# Altium schematic symbol library MCU_ST_STM32F4.SchLib: 300 symbols (part 8 of 10)
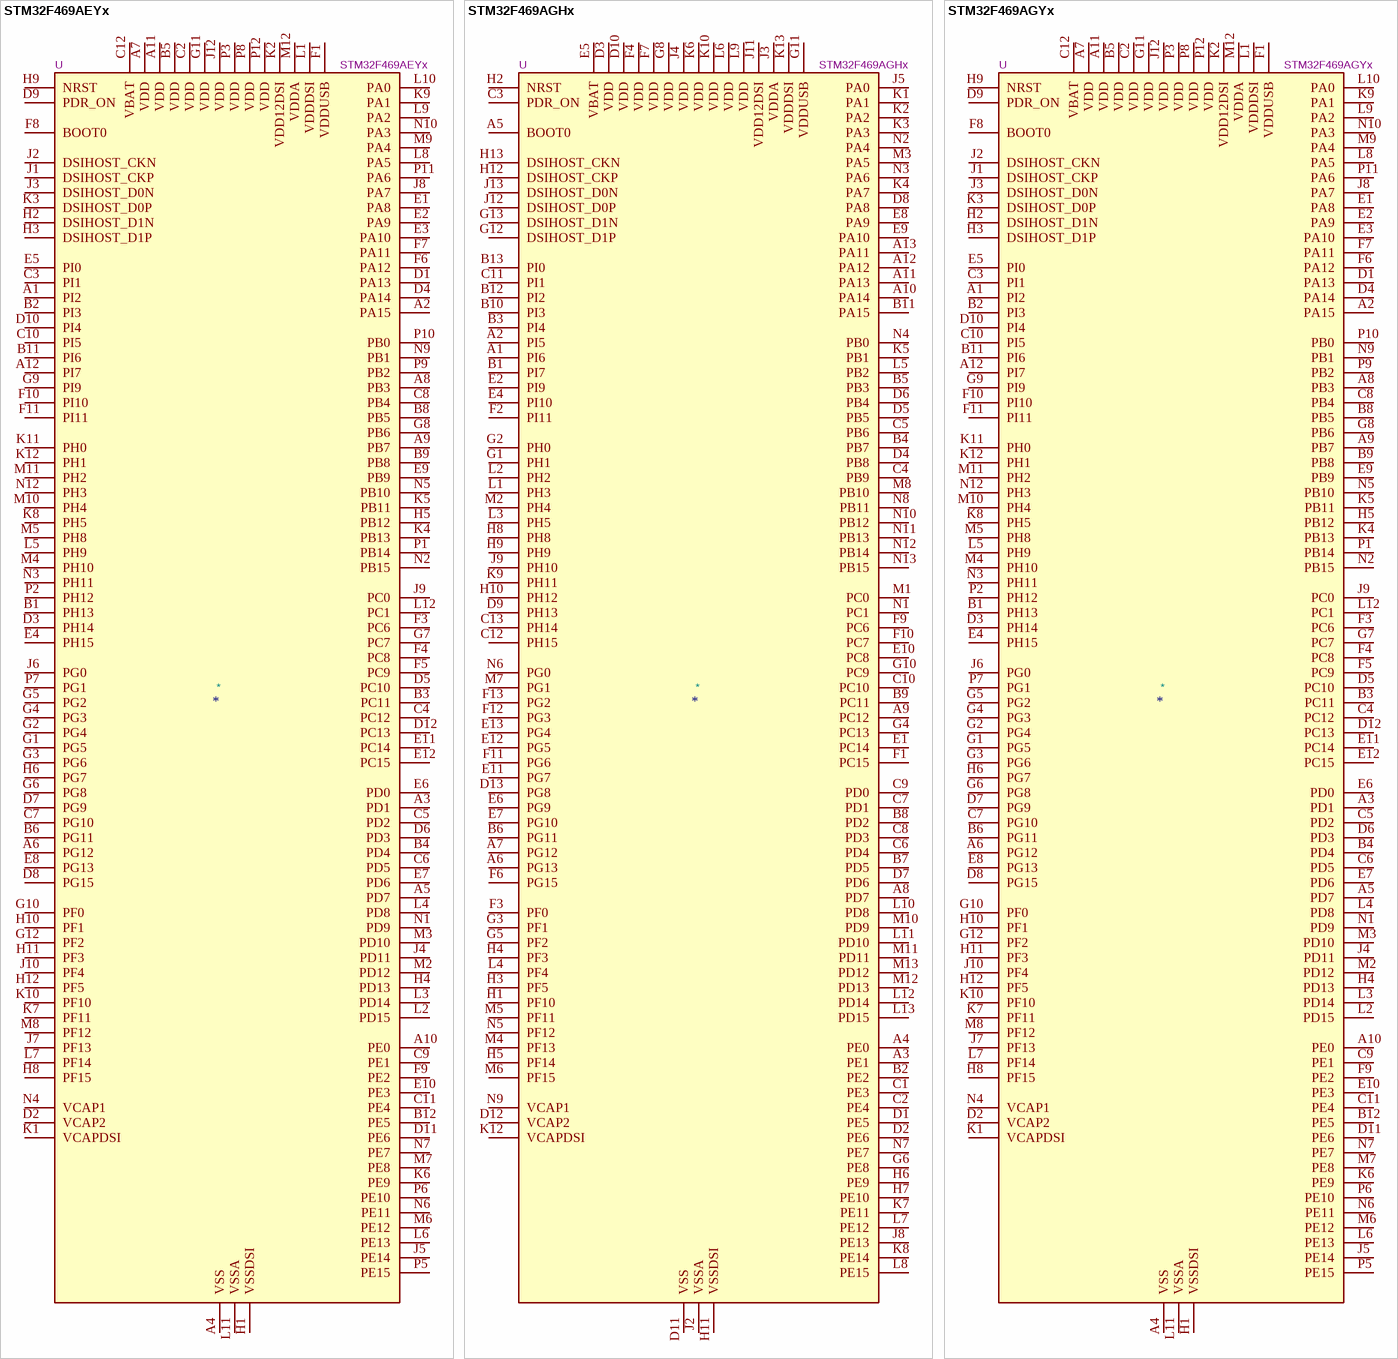
[diagram p83: symbols STM32F469AEYx to STM32F469AGYx]

## STM32F469AGHx
designator *  value STM32F469AGHx  Reference: U
ki_keywords: Arm Cortex-M4 STM32F4 STM32F469/479; ki_description: STMicroelectronics Arm Cortex-M4 MCU, 1024KB flash, 384KB RAM, 180 MHz, 1.7-3.6V, 128 GPIO, UFBGA169; ki_fp_filters: *UFBGA*7x7mm*Layout13x13*P0.5mm*; Footprint: Package_BGA:UFBGA-169_7x7mm_Layout13x13_P0.5mm; Datasheet: https://www.st.com/resource/en/datasheet/stm32f469ag.pdf
pins: A1 PI6, A2 PI5, A3 PE1, A4 PE0, A5 BOOT0, A6 PG13, A7 PG12, A8 PD7, A9 PC12, A10 PA14, A11 PA13, A12 PA12, A13 PA11, B1 PI7, B2 PE2, B3 PI4, B4 PB7, B5 PB3, B6 PG11, B7 PD5, B8 PD2, B9 PC11, B10 PI3, B11 PA15, B12 PI2, B13 PI0, C1 PE3, C2 PE4, C3 PDR_ON, C4 PB9, C5 PB6, C6 PD4, C7 PD1, C8 PD3, C9 PD0, C10 PC10, C11 PI1, C12 PH15, C13 PH14, D1 PE5, D2 PE6, D3 VDD, D4 PB8, D5 PB5, D6 PB4, D7 PD6, D8 PA8, D9 PH13, D10 VDD, D11 VSS, D12 VCAP2, D13 PG8, E1 PC14, E2 PI9, E3 VSS hidden, E4 PI10, E5 VBAT, E6 PG9, E7 PG10, E8 PA9, E9 PA10, E10 PC8, E11 PG7, E12 PG5, E13 PG4, F1 PC15, F2 PI11, F3 PF0, F4 VDD, F5 VSS hidden, F6 PG15, F7 VDD, F8 VSS hidden, F9 PC6, F10 PC7, F11 PG6, F12 PG3, F13 PG2, G1 PH1, G2 PH0, G3 PF1, G4 PC13, G5 PF2, G6 PE8, G7 VSS hidden, G8 VDD, G9 VSS hidden, G10 PC9, G11 VDDUSB, G12 DSIHOST_D1P, G13 DSIHOST_D1N, H1 PF10, H2 NRST, H3 PF5, H4 PF3, H5 PF14, H6 PE9, H7 PE10, H8 PH8, H9 PH9, H10 PH12, H11 VSSDSI, H12 DSIHOST_CKP, H13 DSIHOST_CKN, J1 VSS hidden, J2 VSSA, J3 VDDA, J4 VDD, J5 PA0, J6 VSS hidden, J7 VSS hidden, J8 PE13, J9 PH10, J10 VSS hidden, J11 VDD12DSI, J12 DSIHOST_D0P, J13 DSIHOST_D0N, K1 PA1, K2 PA2, K3 PA3, K4 PA7, K5 PB1, K6 VDD, K7 PE11, K8 PE14, K9 PH11, K10 VDD, K11 VSSDSI hidden, K12 VCAPDSI, K13 VDDDSI, L1 PH3, L2 PH2, L3 PH5, L4 PF4, L5 PB2, L6 VDD, L7 PE12, L8 PE15, L9 VDD, L10 PD8, L11 PD10, L12 PD14, L13 PD15, M1 PC0, M2 PH4, M3 PA5, M4 PF13, M5 PF11, M6 PF15, M7 PG1, M8 PB10, M9 VSS hidden, M10 PD9, M11 PD11, M12 PD13, M13 PD12, N1 PC1, N2 PA4, N3 PA6, N4 PB0, N5 PF12, N6 PG0, N7 PE7, N8 PB11, N9 VCAP1, N10 PB12, N11 PB13, N12 PB14, N13 PB15

## STM32F469AGYx
designator *  value STM32F469AGYx  Reference: U
ki_keywords: Arm Cortex-M4 STM32F4 STM32F469/479; ki_description: STMicroelectronics Arm Cortex-M4 MCU, 1024KB flash, 384KB RAM, 180 MHz, 1.7-3.6V, 128 GPIO, WLCSP168; ki_fp_filters: ST*WLCSP*Die434*; Footprint: Package_CSP:ST_WLCSP-168_Die434; Datasheet: https://www.st.com/resource/en/datasheet/stm32f469ag.pdf
pins: A1 PI2, A2 PA15, A3 PD1, A4 VSS, A5 PD7, A6 PG12, A7 VDD, A8 PB3, A9 PB7, A10 PE0, A11 VDD, A12 PI7, B1 PH13, B2 PI3, B3 PC11, B4 PD4, B5 VDD, B6 PG11, B7 VSS hidden, B8 PB5, B9 PB8, B10 VSS hidden, B11 PI6, B12 PE5, C1 VSS hidden, C2 VDD, C3 PI1, C4 PC12, C5 PD2, C6 PD5, C7 PG10, C8 PB4, C9 PE1, C10 PI5, C11 PE4, C12 VBAT, D1 PA13, D2 VCAP2, D3 PH14, D4 PA14, D5 PC10, D6 PD3, D7 PG9, D8 PG15, D9 PDR_ON, D10 PI4, D11 PE6, D12 PC13, E1 PA8, E2 PA9, E3 PA10, E4 PH15, E5 PI0, E6 PD0, E7 PD6, E8 PG13, E9 PB9, E10 PE3, E11 PC14, E12 PC15, F1 VDDUSB, F2 VSS hidden, F3 PC6, F4 PC8, F5 PC9, F6 PA12, F7 PA11, F8 BOOT0, F9 PE2, F10 PI10, F11 PI11, F12 VSS hidden, G1 PG5, G2 PG4, G3 PG6, G4 PG3, G5 PG2, G6 PG8, G7 PC7, G8 PB6, G9 PI9, G10 PF0, G11 VDD, G12 PF2, H1 VSSDSI, H2 DSIHOST_D1N, H3 DSIHOST_D1P, H4 PD13, H5 PB12, H6 PG7, H7 VSS hidden, H8 PF15, H9 NRST, H10 PF1, H11 PF3, H12 PF5, J1 DSIHOST_CKP, J2 DSIHOST_CKN, J3 DSIHOST_D0N, J4 PD11, J5 PE14, J6 PG0, J7 PF13, J8 PA7, J9 PC0, J10 PF4, J11 VSS hidden, J12 VDD, K1 VCAPDSI, K2 VDD12DSI, K3 DSIHOST_D0P, K4 PB13, K5 PB11, K6 PE9, K7 PF11, K8 PH5, K9 PA1, K10 PF10, K11 PH0, K12 PH1, L1 VDDDSI, L2 PD15, L3 PD14, L4 PD8, L5 PH9, L6 PE13, L7 PF14, L8 PA5, L9 PA2, L10 PA0, L11 VSSA, L12 PC1, M1 VSS hidden, M2 PD12, M3 PD10, M4 PH10, M5 PH8, M6 PE12, M7 PE8, M8 PF12, M9 PA4, M10 PH4, M11 PH2, M12 VDDA, N1 PD9, N2 PB15, N3 PH11, N4 VCAP1, N5 PB10, N6 PE11, N7 PE7, N8 VSS hidden, N9 PB1, N10 PA3, N11 VSS hidden, N12 PH3, P1 PB14, P2 PH12, P3 VDD, P4 VSS hidden, P5 PE15, P6 PE10, P7 PG1, P8 VDD, P9 PB2, P10 PB0, P11 PA6, P12 VDD

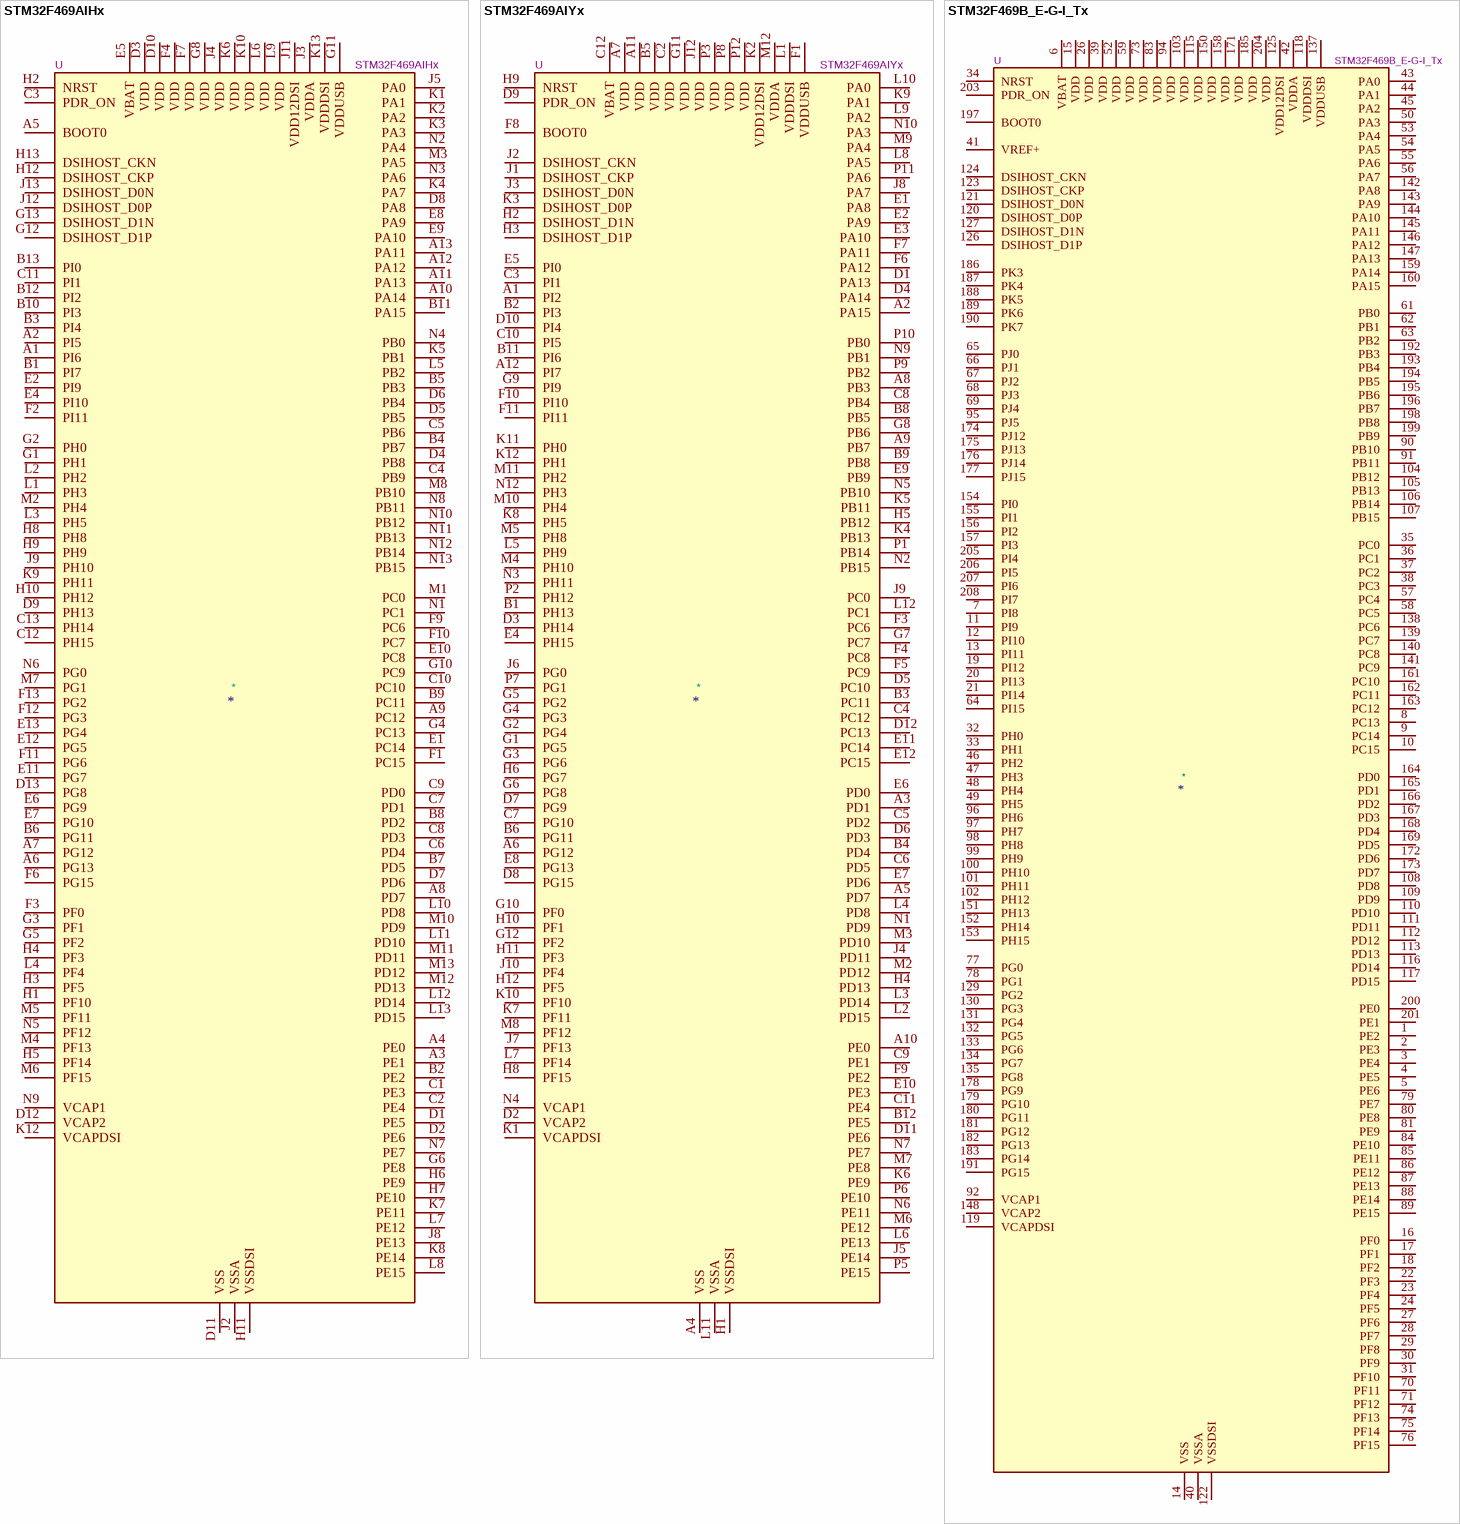
[diagram p60: symbols STM32F469AIHx to STM32F469B_E-G-I_Tx]

## STM32F469AIHx
designator *  value STM32F469AIHx  Reference: U
ki_keywords: Arm Cortex-M4 STM32F4 STM32F469/479; ki_description: STMicroelectronics Arm Cortex-M4 MCU, 2048KB flash, 384KB RAM, 180 MHz, 1.7-3.6V, 128 GPIO, UFBGA169; ki_fp_filters: *UFBGA*7x7mm*Layout13x13*P0.5mm*; Footprint: Package_BGA:UFBGA-169_7x7mm_Layout13x13_P0.5mm; Datasheet: https://www.st.com/resource/en/datasheet/stm32f469ai.pdf
pins: A1 PI6, A2 PI5, A3 PE1, A4 PE0, A5 BOOT0, A6 PG13, A7 PG12, A8 PD7, A9 PC12, A10 PA14, A11 PA13, A12 PA12, A13 PA11, B1 PI7, B2 PE2, B3 PI4, B4 PB7, B5 PB3, B6 PG11, B7 PD5, B8 PD2, B9 PC11, B10 PI3, B11 PA15, B12 PI2, B13 PI0, C1 PE3, C2 PE4, C3 PDR_ON, C4 PB9, C5 PB6, C6 PD4, C7 PD1, C8 PD3, C9 PD0, C10 PC10, C11 PI1, C12 PH15, C13 PH14, D1 PE5, D2 PE6, D3 VDD, D4 PB8, D5 PB5, D6 PB4, D7 PD6, D8 PA8, D9 PH13, D10 VDD, D11 VSS, D12 VCAP2, D13 PG8, E1 PC14, E2 PI9, E3 VSS hidden, E4 PI10, E5 VBAT, E6 PG9, E7 PG10, E8 PA9, E9 PA10, E10 PC8, E11 PG7, E12 PG5, E13 PG4, F1 PC15, F2 PI11, F3 PF0, F4 VDD, F5 VSS hidden, F6 PG15, F7 VDD, F8 VSS hidden, F9 PC6, F10 PC7, F11 PG6, F12 PG3, F13 PG2, G1 PH1, G2 PH0, G3 PF1, G4 PC13, G5 PF2, G6 PE8, G7 VSS hidden, G8 VDD, G9 VSS hidden, G10 PC9, G11 VDDUSB, G12 DSIHOST_D1P, G13 DSIHOST_D1N, H1 PF10, H2 NRST, H3 PF5, H4 PF3, H5 PF14, H6 PE9, H7 PE10, H8 PH8, H9 PH9, H10 PH12, H11 VSSDSI, H12 DSIHOST_CKP, H13 DSIHOST_CKN, J1 VSS hidden, J2 VSSA, J3 VDDA, J4 VDD, J5 PA0, J6 VSS hidden, J7 VSS hidden, J8 PE13, J9 PH10, J10 VSS hidden, J11 VDD12DSI, J12 DSIHOST_D0P, J13 DSIHOST_D0N, K1 PA1, K2 PA2, K3 PA3, K4 PA7, K5 PB1, K6 VDD, K7 PE11, K8 PE14, K9 PH11, K10 VDD, K11 VSSDSI hidden, K12 VCAPDSI, K13 VDDDSI, L1 PH3, L2 PH2, L3 PH5, L4 PF4, L5 PB2, L6 VDD, L7 PE12, L8 PE15, L9 VDD, L10 PD8, L11 PD10, L12 PD14, L13 PD15, M1 PC0, M2 PH4, M3 PA5, M4 PF13, M5 PF11, M6 PF15, M7 PG1, M8 PB10, M9 VSS hidden, M10 PD9, M11 PD11, M12 PD13, M13 PD12, N1 PC1, N2 PA4, N3 PA6, N4 PB0, N5 PF12, N6 PG0, N7 PE7, N8 PB11, N9 VCAP1, N10 PB12, N11 PB13, N12 PB14, N13 PB15

## STM32F469AIYx
designator *  value STM32F469AIYx  Reference: U
ki_keywords: Arm Cortex-M4 STM32F4 STM32F469/479; ki_description: STMicroelectronics Arm Cortex-M4 MCU, 2048KB flash, 384KB RAM, 180 MHz, 1.7-3.6V, 128 GPIO, WLCSP168; ki_fp_filters: ST*WLCSP*Die434*; Footprint: Package_CSP:ST_WLCSP-168_Die434; Datasheet: https://www.st.com/resource/en/datasheet/stm32f469ai.pdf
pins: A1 PI2, A2 PA15, A3 PD1, A4 VSS, A5 PD7, A6 PG12, A7 VDD, A8 PB3, A9 PB7, A10 PE0, A11 VDD, A12 PI7, B1 PH13, B2 PI3, B3 PC11, B4 PD4, B5 VDD, B6 PG11, B7 VSS hidden, B8 PB5, B9 PB8, B10 VSS hidden, B11 PI6, B12 PE5, C1 VSS hidden, C2 VDD, C3 PI1, C4 PC12, C5 PD2, C6 PD5, C7 PG10, C8 PB4, C9 PE1, C10 PI5, C11 PE4, C12 VBAT, D1 PA13, D2 VCAP2, D3 PH14, D4 PA14, D5 PC10, D6 PD3, D7 PG9, D8 PG15, D9 PDR_ON, D10 PI4, D11 PE6, D12 PC13, E1 PA8, E2 PA9, E3 PA10, E4 PH15, E5 PI0, E6 PD0, E7 PD6, E8 PG13, E9 PB9, E10 PE3, E11 PC14, E12 PC15, F1 VDDUSB, F2 VSS hidden, F3 PC6, F4 PC8, F5 PC9, F6 PA12, F7 PA11, F8 BOOT0, F9 PE2, F10 PI10, F11 PI11, F12 VSS hidden, G1 PG5, G2 PG4, G3 PG6, G4 PG3, G5 PG2, G6 PG8, G7 PC7, G8 PB6, G9 PI9, G10 PF0, G11 VDD, G12 PF2, H1 VSSDSI, H2 DSIHOST_D1N, H3 DSIHOST_D1P, H4 PD13, H5 PB12, H6 PG7, H7 VSS hidden, H8 PF15, H9 NRST, H10 PF1, H11 PF3, H12 PF5, J1 DSIHOST_CKP, J2 DSIHOST_CKN, J3 DSIHOST_D0N, J4 PD11, J5 PE14, J6 PG0, J7 PF13, J8 PA7, J9 PC0, J10 PF4, J11 VSS hidden, J12 VDD, K1 VCAPDSI, K2 VDD12DSI, K3 DSIHOST_D0P, K4 PB13, K5 PB11, K6 PE9, K7 PF11, K8 PH5, K9 PA1, K10 PF10, K11 PH0, K12 PH1, L1 VDDDSI, L2 PD15, L3 PD14, L4 PD8, L5 PH9, L6 PE13, L7 PF14, L8 PA5, L9 PA2, L10 PA0, L11 VSSA, L12 PC1, M1 VSS hidden, M2 PD12, M3 PD10, M4 PH10, M5 PH8, M6 PE12, M7 PE8, M8 PF12, M9 PA4, M10 PH4, M11 PH2, M12 VDDA, N1 PD9, N2 PB15, N3 PH11, N4 VCAP1, N5 PB10, N6 PE11, N7 PE7, N8 VSS hidden, N9 PB1, N10 PA3, N11 VSS hidden, N12 PH3, P1 PB14, P2 PH12, P3 VDD, P4 VSS hidden, P5 PE15, P6 PE10, P7 PG1, P8 VDD, P9 PB2, P10 PB0, P11 PA6, P12 VDD

## STM32F469B_E-G-I_Tx
designator *  value STM32F469B_E-G-I_Tx  Reference: U
ki_keywords: Arm Cortex-M4 STM32F4 STM32F469/479; ki_description: STMicroelectronics Arm Cortex-M4 MCU, 512-2048KB flash, 384KB RAM, 180 MHz, 1.7-3.6V, 159 GPIO, LQFP208; ki_fp_filters: LQFP*28x28mm*P0.5mm*; Footprint: Package_QFP:LQFP-208_28x28mm_P0.5mm; Datasheet: https://www.st.com/resource/en/datasheet/stm32f469be.pdf
pins: 1 PE2, 2 PE3, 3 PE4, 4 PE5, 5 PE6, 6 VBAT, 7 PI8, 8 PC13, 9 PC14, 10 PC15, 11 PI9, 12 PI10, 13 PI11, 14 VSS, 15 VDD, 16 PF0, 17 PF1, 18 PF2, 19 PI12, 20 PI13, 21 PI14, 22 PF3, 23 PF4, 24 PF5, 25 VSS hidden, 26 VDD, 27 PF6, 28 PF7, 29 PF8, 30 PF9, 31 PF10, 32 PH0, 33 PH1, 34 NRST, 35 PC0, 36 PC1, 37 PC2, 38 PC3, 39 VDD, 40 VSSA, 41 VREF+, 42 VDDA, 43 PA0, 44 PA1, 45 PA2, 46 PH2, 47 PH3, 48 PH4, 49 PH5, 50 PA3, 51 VSS hidden, 52 VDD, 53 PA4, 54 PA5, 55 PA6, 56 PA7, 57 PC4, 58 PC5, 59 VDD, 60 VSS hidden, 61 PB0, 62 PB1, 63 PB2, 64 PI15, 65 PJ0, 66 PJ1, 67 PJ2, 68 PJ3, 69 PJ4, 70 PF11, 71 PF12, 72 VSS hidden, 73 VDD, 74 PF13, 75 PF14, 76 PF15, 77 PG0, 78 PG1, 79 PE7, 80 PE8, 81 PE9, 82 VSS hidden, 83 VDD, 84 PE10, 85 PE11, 86 PE12, 87 PE13, 88 PE14, 89 PE15, 90 PB10, 91 PB11, 92 VCAP1, 93 VSS hidden, 94 VDD, 95 PJ5, 96 PH6, 97 PH7, 98 PH8, 99 PH9, 100 PH10, 101 PH11, 102 PH12, 103 VDD, 104 PB12, 105 PB13, 106 PB14, 107 PB15, 108 PD8, 109 PD9, 110 PD10, 111 PD11, 112 PD12, 113 PD13, 114 VSS hidden, 115 VDD, 116 PD14, 117 PD15, 118 VDDDSI, 119 VCAPDSI, 120 DSIHOST_D0P, 121 DSIHOST_D0N, 122 VSSDSI, 123 DSIHOST_CKP, 124 DSIHOST_CKN, 125 VDD12DSI, 126 DSIHOST_D1P, 127 DSIHOST_D1N, 128 VSSDSI hidden, 129 PG2, 130 PG3, 131 PG4, 132 PG5, 133 PG6, 134 PG7, 135 PG8, 136 VSS hidden, 137 VDDUSB, 138 PC6, 139 PC7, 140 PC8, 141 PC9, 142 PA8, 143 PA9, 144 PA10, 145 PA11, 146 PA12, 147 PA13, 148 VCAP2, 149 VSS hidden, 150 VDD, 151 PH13, 152 PH14, 153 PH15, 154 PI0, 155 PI1, 156 PI2, 157 PI3, 158 VDD, 159 PA14, 160 PA15, 161 PC10, 162 PC11, 163 PC12, 164 PD0, 165 PD1, 166 PD2, 167 PD3, 168 PD4, 169 PD5, 170 VSS hidden, 171 VDD, 172 PD6, 173 PD7, 174 PJ12, 175 PJ13, 176 PJ14, 177 PJ15, 178 PG9, 179 PG10, 180 PG11, 181 PG12, 182 PG13, 183 PG14, 184 VSS hidden, 185 VDD, 186 PK3, 187 PK4, 188 PK5, 189 PK6, 190 PK7, 191 PG15, 192 PB3, 193 PB4, 194 PB5, 195 PB6, 196 PB7, 197 BOOT0, 198 PB8, 199 PB9, 200 PE0, 201 PE1, 202 VSS hidden, 203 PDR_ON, 204 VDD, 205 PI4, 206 PI5, 207 PI6, 208 PI7

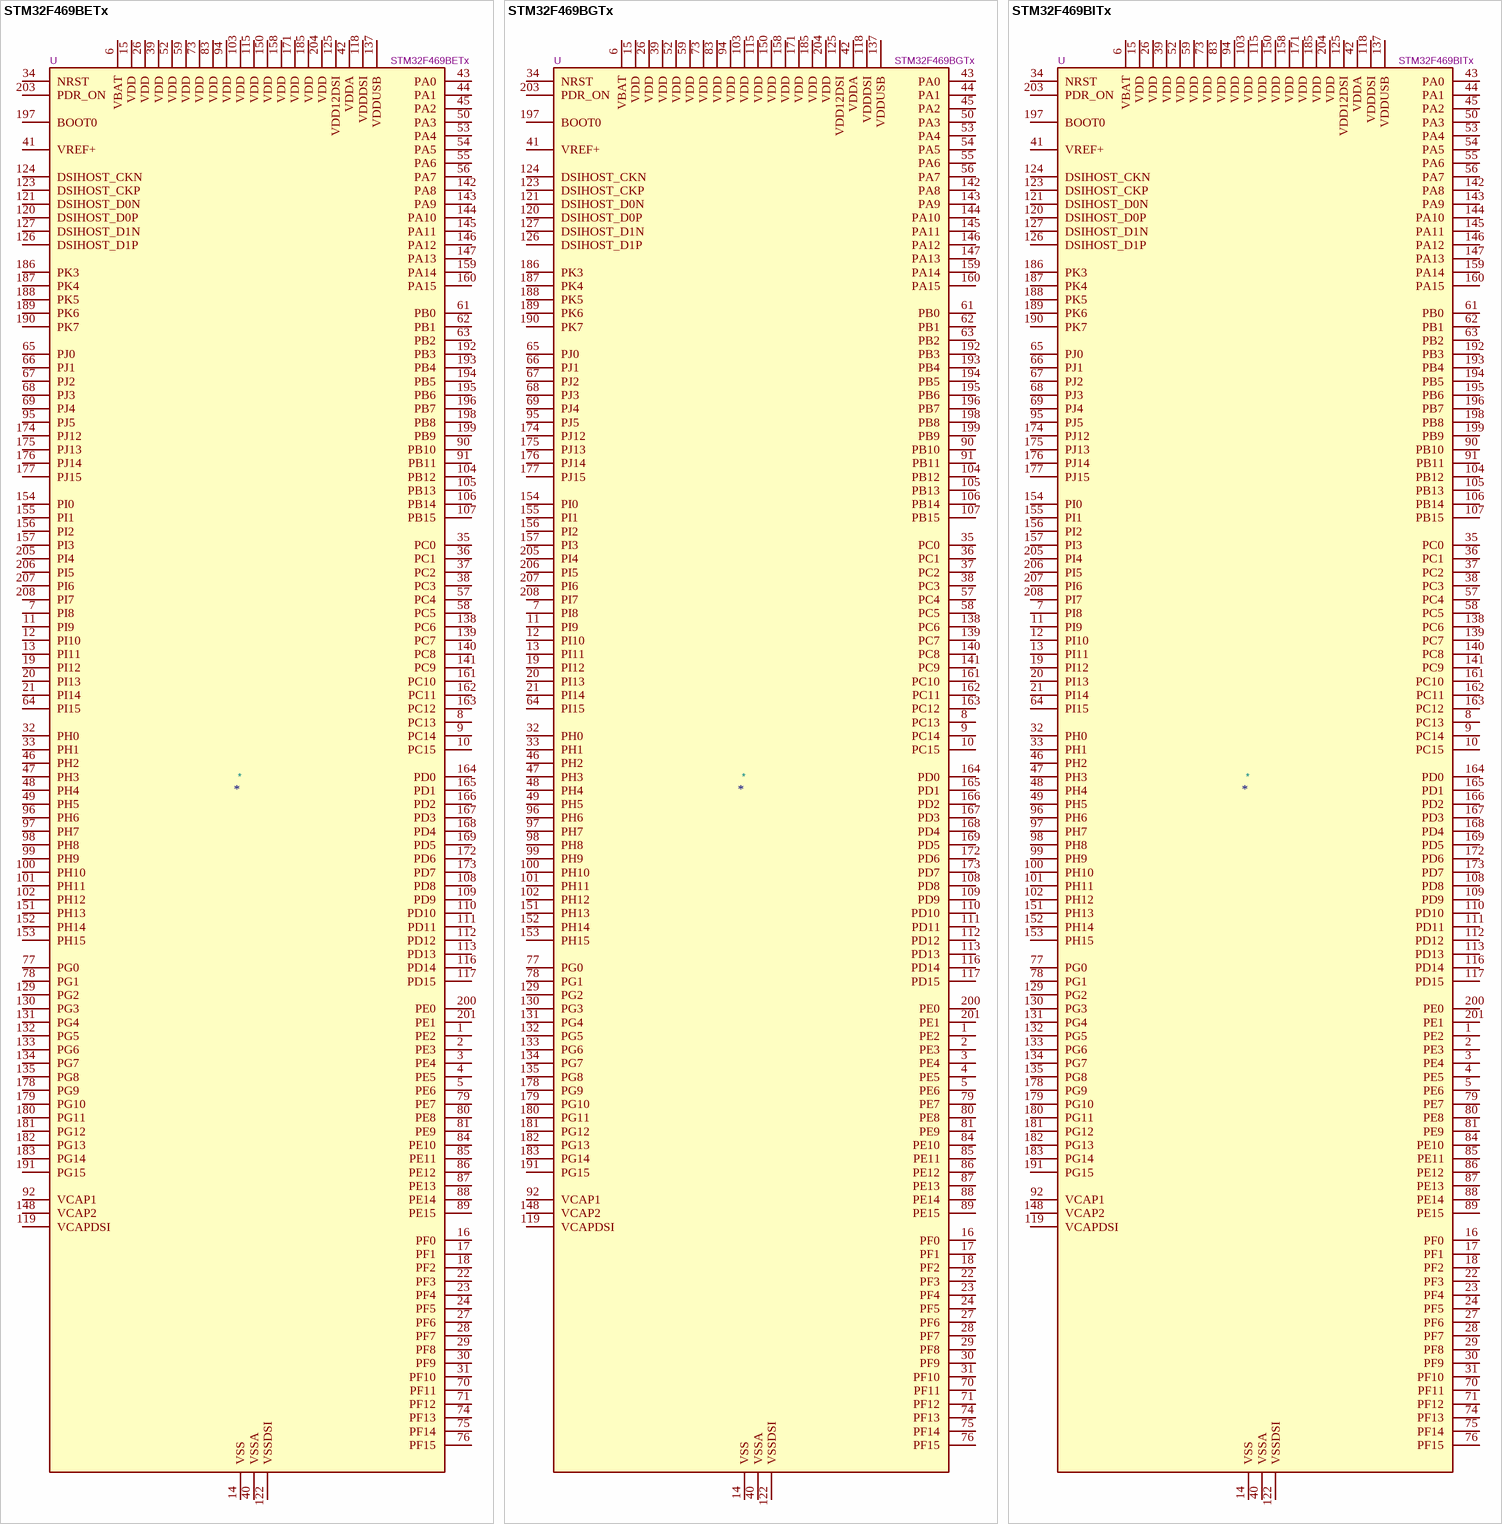
[diagram p61: symbols STM32F469BETx to STM32F469BITx]

## STM32F469BETx
designator *  value STM32F469BETx  Reference: U
ki_keywords: Arm Cortex-M4 STM32F4 STM32F469/479; ki_description: STMicroelectronics Arm Cortex-M4 MCU, 512KB flash, 384KB RAM, 180 MHz, 1.7-3.6V, 159 GPIO, LQFP208; ki_fp_filters: LQFP*28x28mm*P0.5mm*; Footprint: Package_QFP:LQFP-208_28x28mm_P0.5mm; Datasheet: https://www.st.com/resource/en/datasheet/stm32f469be.pdf
pins: 1 PE2, 2 PE3, 3 PE4, 4 PE5, 5 PE6, 6 VBAT, 7 PI8, 8 PC13, 9 PC14, 10 PC15, 11 PI9, 12 PI10, 13 PI11, 14 VSS, 15 VDD, 16 PF0, 17 PF1, 18 PF2, 19 PI12, 20 PI13, 21 PI14, 22 PF3, 23 PF4, 24 PF5, 25 VSS hidden, 26 VDD, 27 PF6, 28 PF7, 29 PF8, 30 PF9, 31 PF10, 32 PH0, 33 PH1, 34 NRST, 35 PC0, 36 PC1, 37 PC2, 38 PC3, 39 VDD, 40 VSSA, 41 VREF+, 42 VDDA, 43 PA0, 44 PA1, 45 PA2, 46 PH2, 47 PH3, 48 PH4, 49 PH5, 50 PA3, 51 VSS hidden, 52 VDD, 53 PA4, 54 PA5, 55 PA6, 56 PA7, 57 PC4, 58 PC5, 59 VDD, 60 VSS hidden, 61 PB0, 62 PB1, 63 PB2, 64 PI15, 65 PJ0, 66 PJ1, 67 PJ2, 68 PJ3, 69 PJ4, 70 PF11, 71 PF12, 72 VSS hidden, 73 VDD, 74 PF13, 75 PF14, 76 PF15, 77 PG0, 78 PG1, 79 PE7, 80 PE8, 81 PE9, 82 VSS hidden, 83 VDD, 84 PE10, 85 PE11, 86 PE12, 87 PE13, 88 PE14, 89 PE15, 90 PB10, 91 PB11, 92 VCAP1, 93 VSS hidden, 94 VDD, 95 PJ5, 96 PH6, 97 PH7, 98 PH8, 99 PH9, 100 PH10, 101 PH11, 102 PH12, 103 VDD, 104 PB12, 105 PB13, 106 PB14, 107 PB15, 108 PD8, 109 PD9, 110 PD10, 111 PD11, 112 PD12, 113 PD13, 114 VSS hidden, 115 VDD, 116 PD14, 117 PD15, 118 VDDDSI, 119 VCAPDSI, 120 DSIHOST_D0P, 121 DSIHOST_D0N, 122 VSSDSI, 123 DSIHOST_CKP, 124 DSIHOST_CKN, 125 VDD12DSI, 126 DSIHOST_D1P, 127 DSIHOST_D1N, 128 VSSDSI hidden, 129 PG2, 130 PG3, 131 PG4, 132 PG5, 133 PG6, 134 PG7, 135 PG8, 136 VSS hidden, 137 VDDUSB, 138 PC6, 139 PC7, 140 PC8, 141 PC9, 142 PA8, 143 PA9, 144 PA10, 145 PA11, 146 PA12, 147 PA13, 148 VCAP2, 149 VSS hidden, 150 VDD, 151 PH13, 152 PH14, 153 PH15, 154 PI0, 155 PI1, 156 PI2, 157 PI3, 158 VDD, 159 PA14, 160 PA15, 161 PC10, 162 PC11, 163 PC12, 164 PD0, 165 PD1, 166 PD2, 167 PD3, 168 PD4, 169 PD5, 170 VSS hidden, 171 VDD, 172 PD6, 173 PD7, 174 PJ12, 175 PJ13, 176 PJ14, 177 PJ15, 178 PG9, 179 PG10, 180 PG11, 181 PG12, 182 PG13, 183 PG14, 184 VSS hidden, 185 VDD, 186 PK3, 187 PK4, 188 PK5, 189 PK6, 190 PK7, 191 PG15, 192 PB3, 193 PB4, 194 PB5, 195 PB6, 196 PB7, 197 BOOT0, 198 PB8, 199 PB9, 200 PE0, 201 PE1, 202 VSS hidden, 203 PDR_ON, 204 VDD, 205 PI4, 206 PI5, 207 PI6, 208 PI7

## STM32F469BGTx
designator *  value STM32F469BGTx  Reference: U
ki_keywords: Arm Cortex-M4 STM32F4 STM32F469/479; ki_description: STMicroelectronics Arm Cortex-M4 MCU, 1024KB flash, 384KB RAM, 180 MHz, 1.7-3.6V, 159 GPIO, LQFP208; ki_fp_filters: LQFP*28x28mm*P0.5mm*; Footprint: Package_QFP:LQFP-208_28x28mm_P0.5mm; Datasheet: https://www.st.com/resource/en/datasheet/stm32f469bg.pdf
pins: 1 PE2, 2 PE3, 3 PE4, 4 PE5, 5 PE6, 6 VBAT, 7 PI8, 8 PC13, 9 PC14, 10 PC15, 11 PI9, 12 PI10, 13 PI11, 14 VSS, 15 VDD, 16 PF0, 17 PF1, 18 PF2, 19 PI12, 20 PI13, 21 PI14, 22 PF3, 23 PF4, 24 PF5, 25 VSS hidden, 26 VDD, 27 PF6, 28 PF7, 29 PF8, 30 PF9, 31 PF10, 32 PH0, 33 PH1, 34 NRST, 35 PC0, 36 PC1, 37 PC2, 38 PC3, 39 VDD, 40 VSSA, 41 VREF+, 42 VDDA, 43 PA0, 44 PA1, 45 PA2, 46 PH2, 47 PH3, 48 PH4, 49 PH5, 50 PA3, 51 VSS hidden, 52 VDD, 53 PA4, 54 PA5, 55 PA6, 56 PA7, 57 PC4, 58 PC5, 59 VDD, 60 VSS hidden, 61 PB0, 62 PB1, 63 PB2, 64 PI15, 65 PJ0, 66 PJ1, 67 PJ2, 68 PJ3, 69 PJ4, 70 PF11, 71 PF12, 72 VSS hidden, 73 VDD, 74 PF13, 75 PF14, 76 PF15, 77 PG0, 78 PG1, 79 PE7, 80 PE8, 81 PE9, 82 VSS hidden, 83 VDD, 84 PE10, 85 PE11, 86 PE12, 87 PE13, 88 PE14, 89 PE15, 90 PB10, 91 PB11, 92 VCAP1, 93 VSS hidden, 94 VDD, 95 PJ5, 96 PH6, 97 PH7, 98 PH8, 99 PH9, 100 PH10, 101 PH11, 102 PH12, 103 VDD, 104 PB12, 105 PB13, 106 PB14, 107 PB15, 108 PD8, 109 PD9, 110 PD10, 111 PD11, 112 PD12, 113 PD13, 114 VSS hidden, 115 VDD, 116 PD14, 117 PD15, 118 VDDDSI, 119 VCAPDSI, 120 DSIHOST_D0P, 121 DSIHOST_D0N, 122 VSSDSI, 123 DSIHOST_CKP, 124 DSIHOST_CKN, 125 VDD12DSI, 126 DSIHOST_D1P, 127 DSIHOST_D1N, 128 VSSDSI hidden, 129 PG2, 130 PG3, 131 PG4, 132 PG5, 133 PG6, 134 PG7, 135 PG8, 136 VSS hidden, 137 VDDUSB, 138 PC6, 139 PC7, 140 PC8, 141 PC9, 142 PA8, 143 PA9, 144 PA10, 145 PA11, 146 PA12, 147 PA13, 148 VCAP2, 149 VSS hidden, 150 VDD, 151 PH13, 152 PH14, 153 PH15, 154 PI0, 155 PI1, 156 PI2, 157 PI3, 158 VDD, 159 PA14, 160 PA15, 161 PC10, 162 PC11, 163 PC12, 164 PD0, 165 PD1, 166 PD2, 167 PD3, 168 PD4, 169 PD5, 170 VSS hidden, 171 VDD, 172 PD6, 173 PD7, 174 PJ12, 175 PJ13, 176 PJ14, 177 PJ15, 178 PG9, 179 PG10, 180 PG11, 181 PG12, 182 PG13, 183 PG14, 184 VSS hidden, 185 VDD, 186 PK3, 187 PK4, 188 PK5, 189 PK6, 190 PK7, 191 PG15, 192 PB3, 193 PB4, 194 PB5, 195 PB6, 196 PB7, 197 BOOT0, 198 PB8, 199 PB9, 200 PE0, 201 PE1, 202 VSS hidden, 203 PDR_ON, 204 VDD, 205 PI4, 206 PI5, 207 PI6, 208 PI7

## STM32F469BITx
designator *  value STM32F469BITx  Reference: U
ki_keywords: Arm Cortex-M4 STM32F4 STM32F469/479; ki_description: STMicroelectronics Arm Cortex-M4 MCU, 2048KB flash, 384KB RAM, 180 MHz, 1.7-3.6V, 159 GPIO, LQFP208; ki_fp_filters: LQFP*28x28mm*P0.5mm*; Footprint: Package_QFP:LQFP-208_28x28mm_P0.5mm; Datasheet: https://www.st.com/resource/en/datasheet/stm32f469bi.pdf
pins: 1 PE2, 2 PE3, 3 PE4, 4 PE5, 5 PE6, 6 VBAT, 7 PI8, 8 PC13, 9 PC14, 10 PC15, 11 PI9, 12 PI10, 13 PI11, 14 VSS, 15 VDD, 16 PF0, 17 PF1, 18 PF2, 19 PI12, 20 PI13, 21 PI14, 22 PF3, 23 PF4, 24 PF5, 25 VSS hidden, 26 VDD, 27 PF6, 28 PF7, 29 PF8, 30 PF9, 31 PF10, 32 PH0, 33 PH1, 34 NRST, 35 PC0, 36 PC1, 37 PC2, 38 PC3, 39 VDD, 40 VSSA, 41 VREF+, 42 VDDA, 43 PA0, 44 PA1, 45 PA2, 46 PH2, 47 PH3, 48 PH4, 49 PH5, 50 PA3, 51 VSS hidden, 52 VDD, 53 PA4, 54 PA5, 55 PA6, 56 PA7, 57 PC4, 58 PC5, 59 VDD, 60 VSS hidden, 61 PB0, 62 PB1, 63 PB2, 64 PI15, 65 PJ0, 66 PJ1, 67 PJ2, 68 PJ3, 69 PJ4, 70 PF11, 71 PF12, 72 VSS hidden, 73 VDD, 74 PF13, 75 PF14, 76 PF15, 77 PG0, 78 PG1, 79 PE7, 80 PE8, 81 PE9, 82 VSS hidden, 83 VDD, 84 PE10, 85 PE11, 86 PE12, 87 PE13, 88 PE14, 89 PE15, 90 PB10, 91 PB11, 92 VCAP1, 93 VSS hidden, 94 VDD, 95 PJ5, 96 PH6, 97 PH7, 98 PH8, 99 PH9, 100 PH10, 101 PH11, 102 PH12, 103 VDD, 104 PB12, 105 PB13, 106 PB14, 107 PB15, 108 PD8, 109 PD9, 110 PD10, 111 PD11, 112 PD12, 113 PD13, 114 VSS hidden, 115 VDD, 116 PD14, 117 PD15, 118 VDDDSI, 119 VCAPDSI, 120 DSIHOST_D0P, 121 DSIHOST_D0N, 122 VSSDSI, 123 DSIHOST_CKP, 124 DSIHOST_CKN, 125 VDD12DSI, 126 DSIHOST_D1P, 127 DSIHOST_D1N, 128 VSSDSI hidden, 129 PG2, 130 PG3, 131 PG4, 132 PG5, 133 PG6, 134 PG7, 135 PG8, 136 VSS hidden, 137 VDDUSB, 138 PC6, 139 PC7, 140 PC8, 141 PC9, 142 PA8, 143 PA9, 144 PA10, 145 PA11, 146 PA12, 147 PA13, 148 VCAP2, 149 VSS hidden, 150 VDD, 151 PH13, 152 PH14, 153 PH15, 154 PI0, 155 PI1, 156 PI2, 157 PI3, 158 VDD, 159 PA14, 160 PA15, 161 PC10, 162 PC11, 163 PC12, 164 PD0, 165 PD1, 166 PD2, 167 PD3, 168 PD4, 169 PD5, 170 VSS hidden, 171 VDD, 172 PD6, 173 PD7, 174 PJ12, 175 PJ13, 176 PJ14, 177 PJ15, 178 PG9, 179 PG10, 180 PG11, 181 PG12, 182 PG13, 183 PG14, 184 VSS hidden, 185 VDD, 186 PK3, 187 PK4, 188 PK5, 189 PK6, 190 PK7, 191 PG15, 192 PB3, 193 PB4, 194 PB5, 195 PB6, 196 PB7, 197 BOOT0, 198 PB8, 199 PB9, 200 PE0, 201 PE1, 202 VSS hidden, 203 PDR_ON, 204 VDD, 205 PI4, 206 PI5, 207 PI6, 208 PI7